# Altium footprint library standard.PcbLib: 330 footprints (part 14 of 21)
Each footprint in its own frame and in the unit in brackets; x right, y up, seen from the top. Pads: shape width x height; smd on the part's side, far side on the other; paste and mask are expansions set on the pad; w line width, h text height; cw(c..) or ccw(c..) is an arc to the next point about the centre after c.
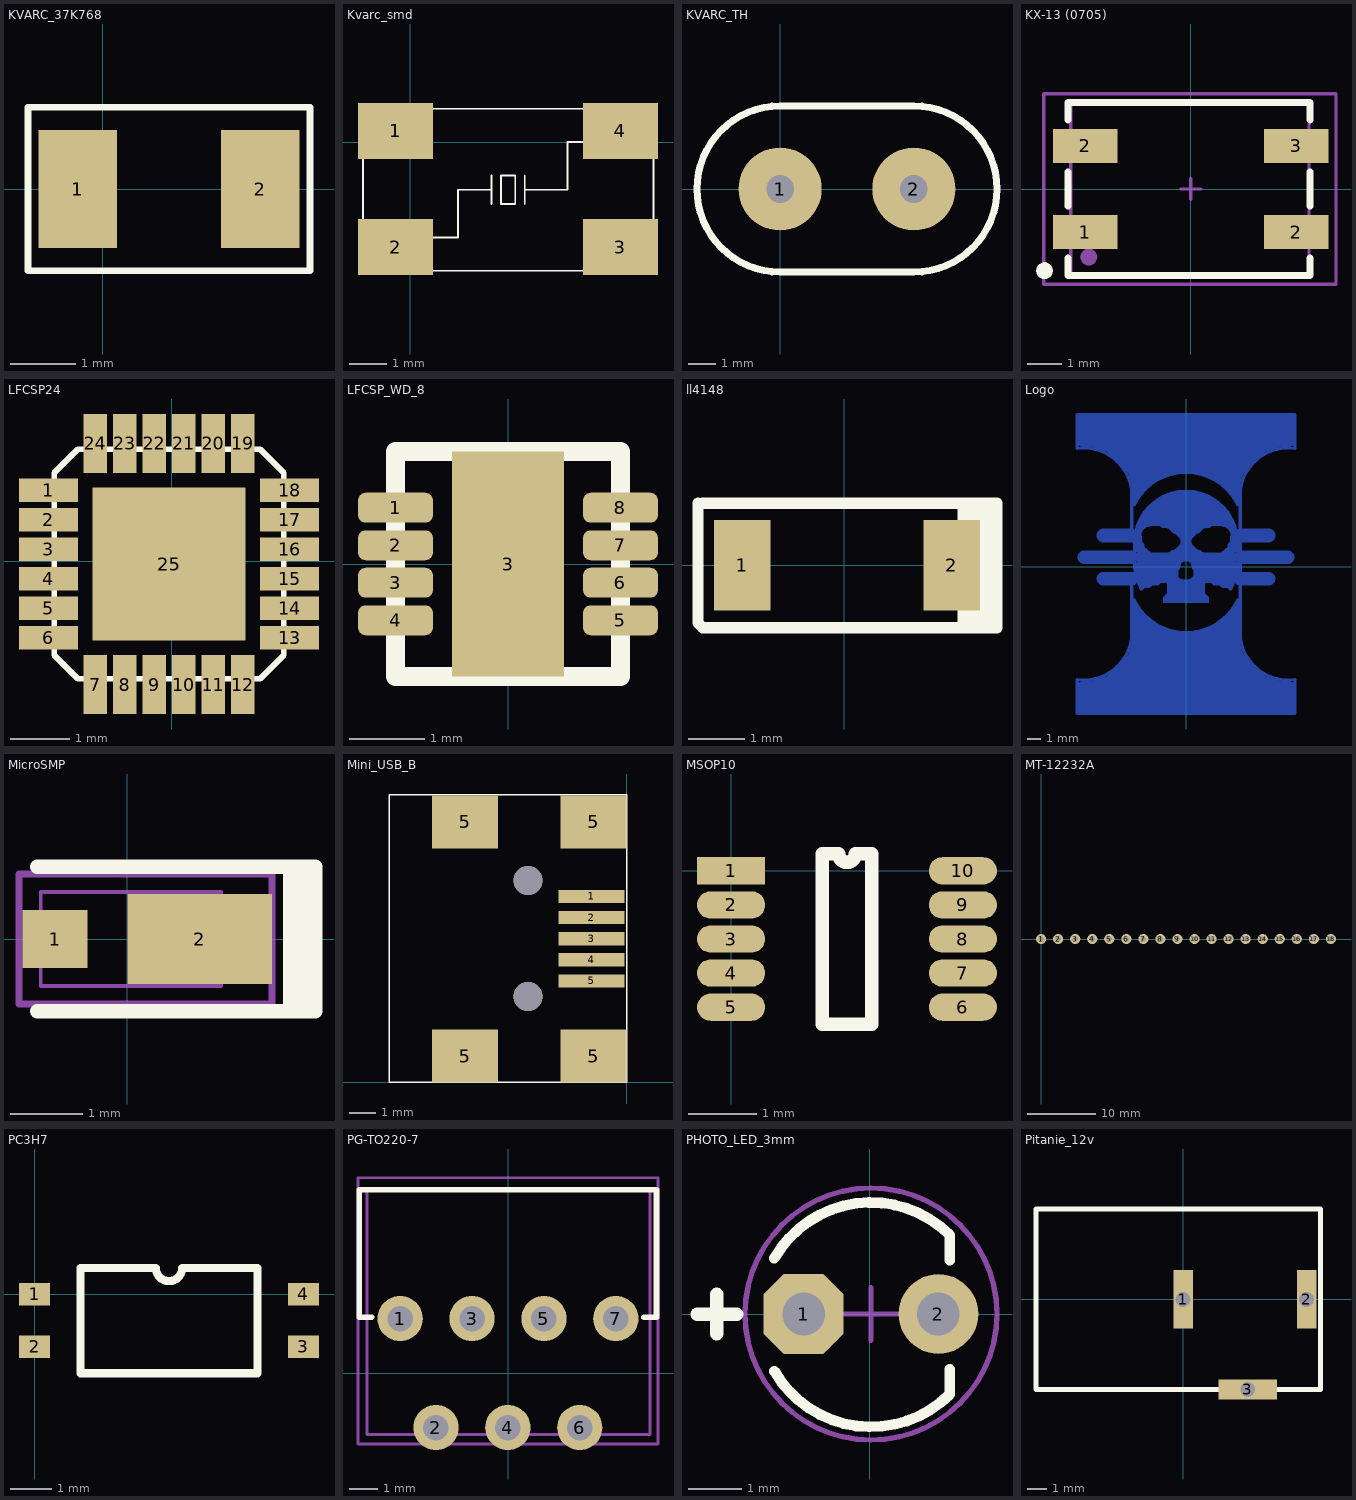
[diagram p13: the footprints below, top view; thin cyan lines are the x and y axes]

## KVARC_37K768 [mm]
pads (2):
  rect 1.2x1.8 smd: 1(-0.381,0) 2(2.413,0)
Top Overlay:
  lines w0.1: 0.375,1.25 1.235,1.25 3.175,1.25 3.175,-1.25 1.235,-1.25 -1.143,-1.25 -1.143,1.25 1.625,1.25

## Kvarc_smd [mm]
pads (4):
  rect 2x1.5 smd: 1(-0.4,0.3) 2(-0.4,-2.8) 3(5.6,-2.8) 4(5.6,0.3)
Top Overlay:
  lines w0.05: 0,-2.54 1.27,-2.54 1.27,-1.27 2.159,-1.27 ; 2.159,-1.651 2.159,-0.889 ; 3.048,-1.651 3.048,-0.889 ; 3.048,-1.27 4.191,-1.27 4.191,0 5.207,0 ; -1.27,-3.429 6.477,-3.429 6.477,0.889 -1.27,0.889 -1.27,-3.429 ; 2.413,-1.651 2.413,-0.889 2.794,-0.889 2.794,-1.651 2.413,-1.651

## KVARC_TH [mm]
pads (2):
  round 3 hole 1: 1(0,0) 2(4.826,0)
Top Overlay:
  lines w0.254: 0,-3 cw(c0,0) 0,3 4.826,3 cw(c4.826,0) 4.826,-3 0,-3
3D body "User Library-HC49S-1.STEP": height 3.6, standoff -3, extent -3.05,-2.245 7.93,2.246

## KX-13 (0705) [mm]
height 1.2
pads (6):
  rect 1.9x1 smd: 1(-3.1,-1.27) 2(-3.1,1.27) 2(3.1,-1.27) 3(3.1,1.27)
  round 0.5 on Top Overlay: ""(-4.3,-2.4)
  round 0.5 on Mech1: ""(-3,-2)
Top Overlay:
  lines w0.2: -3.608,-2.032 -3.608,-2.54 3.504,-2.54 3.504,-2.032 ; -3.608,-0.508 -3.608,0.508 ; -3.608,2.032 -3.608,2.54 3.504,2.54 3.504,2.032 ; 3.504,-0.508 3.504,0.508
Mechanical 1:
  lines w0.1: -3.526,-2.5 3.474,-2.5 3.474,2.5 -3.526,2.5 -3.526,-2.5
Mechanical 15:
  lines w0.1: -0.3,0 0.3,0 ; 0,-0.3 0,-0.2 0,0.3 ; -4.318,-2.794 -4.318,2.794 4.266,2.794 4.266,-2.794 -4.318,-2.794
3D body "KX-13 QSMD7.0x5.0x1.3.step": height 1.3, standoff 0, extent -3.526,-2.5 3.474,2.5

## LFCSP24 [mm]
pads (25):
  rect 1x0.4 smd: 1(-2.1,1.2) 2(-2.1,0.7) 3(-2.1,0.2) 4(-2.1,-0.3) 5(-2.1,-0.8) 6(-2.1,-1.3) 13(2,-1.3) 14(2,-0.8) 15(2,-0.3) 16(2,0.2) 17(2,0.7) 18(2,1.2)
  rect 0.4x1 smd: 7(-1.3,-2.1) 8(-0.8,-2.1) 9(-0.3,-2.1) 10(0.2,-2.1) 11(0.7,-2.1) 12(1.2,-2.1) 19(1.2,2) 20(0.7,2) 21(0.2,2) 22(-0.3,2) 23(-0.8,2) 24(-1.3,2)
  rect 2.6x2.6 smd: 25(-0.05,-0.05)
Top Overlay:
  lines w0.1: -2,-1.6 -1.6,-2 ; -2,-1.6 -2,1.5 ; -2,-1.6 -1.6,-2 ; -2,1.5 -1.6,1.9 ; -2,1.5 -1.6,1.9 ; -1.6,-2 1.5,-2 ; -1.6,1.9 1.5,1.9 1.9,1.5 1.9,-1.6 ; 1.5,-2 1.9,-1.6 ; 1.5,-2 1.9,-1.6

## LFCSP_WD_8 [mm] "8-Lead Lead Frame Chip Scale Package [LFCSP_WD]"
height 0.8
pads (9):
  rrect50% 1x0.4 smd paste+0 mask+0.102: 1(-1.5,0.75) 2(-1.5,0.25) 3(-1.5,-0.25) 4(-1.5,-0.75) 5(1.5,-0.75) 6(1.5,-0.25) 7(1.5,0.25) 8(1.5,0.75)
  rect 1.5x3 smd: 3(0,0)
Top Overlay:
  lines w0.254: -1.5,-1.5 1.5,-1.5 1.5,1.5 -1.5,1.5 -1.5,-1.5

## ll4148 [mm]
pads (2):
  rect 1x1.6 smd: 1(-1.8,0) 2(1.9,0)
Top Overlay:
  rectangle: 2,-1.1 2.7,1.148
  lines w0.2: -2.582,1.1 -2.582,0.932 -2.582,-1.018 -2.5,-1.1 2.7,-1.1 2.7,1.1 -2.5,1.1

## Logo [mm]
Bottom Layer:
  region: 108 vertices and 3 holes, not listed, extent -3.865,-2.665 3.865,5.674
  region: -3.58,-2.667 -3.28,-3.117 -2.923,-3.523 -2.517,-3.88 -2.067,-4.18 -1.582,-4.419 -1.07,-4.593 -0.54,-4.698 0,-4.734 0.54,-4.698 1.07,-4.593 1.582,-4.419 2.067,-4.18 2.517,-3.88 2.923,-3.523 3.28,-3.117 3.58,-2.667 3.741,-2.34 3.865,-2.369 3.865,-5.3 3.871,-5.315 3.869,-5.319 3.873,-5.374 4.008,-5.935 4.228,-6.467 4.529,-6.958 4.904,-7.396 5.342,-7.771 5.833,-8.072 6.365,-8.292 6.926,-8.427 7.5,-8.472 7.771,-8.45 7.865,-8.537 7.865,-10.665 -7.865,-10.665 -7.865,-8.537 -7.771,-8.45 -7.5,-8.472 -6.926,-8.427 -6.365,-8.292 -5.833,-8.072 -5.342,-7.771 -4.904,-7.396 -4.529,-6.958 -4.228,-6.467 -4.008,-5.935 -3.873,-5.374 -3.869,-5.319 -3.871,-5.315 -3.865,-5.3 -3.865,-2.369 -3.741,-2.34
  region: 7.865,8.937 7.771,8.85 7.5,8.872 6.926,8.827 6.365,8.692 5.833,8.472 5.342,8.171 4.904,7.796 4.529,7.358 4.228,6.867 4.008,6.335 3.873,5.774 3.869,5.719 3.871,5.715 3.865,5.7 3.865,4.469 3.741,4.44 3.58,4.767 3.28,5.217 2.923,5.623 2.517,5.98 2.067,6.28 1.582,6.519 1.07,6.693 0.54,6.798 0,6.834 -0.54,6.798 -1.07,6.693 -1.582,6.519 -2.067,6.28 -2.517,5.98 -2.923,5.623 -3.28,5.217 -3.58,4.767 -3.741,4.44 -3.865,4.469 -3.865,5.7 -3.871,5.715 -3.869,5.719 -3.873,5.774 -4.008,6.335 -4.228,6.867 -4.529,7.358 -4.904,7.796 -5.342,8.171 -5.833,8.472 -6.365,8.692 -6.926,8.827 -7.5,8.872 -7.771,8.85 -7.865,8.937 -7.865,11.065 7.865,11.065
  lines w0.25: -4,-0.9 -4,-5.3 cw(c-7.5,-4.8) -8,-8.3 -8,-10.8 0,-10.8 8,-10.8 8,-8.3 cw(c7.5,-4.8) 4,-5.3 4,5.7 cw(c7.5,5.2) 8,8.7 8,11.2 0,11.2 -8,11.2 -8,8.7 cw(c-7.5,5.2) -4,5.7 -4,2.3
  lines w1: -7.5,0.7 -4,0.7 ; -6.1,-0.9 -4,-0.9 ; -6.1,2.3 -4,2.3 ; 4,-0.9 6.1,-0.9 ; 4,0.7 7.5,0.7 ; 4,2.3 6.1,2.3

## MicroSMP [mm] "Schottky Diode, 2-Leads, Body 2,2x1,3mm, 0.4W"
height 0.7
pads (3):
  rect 0.9x0.8 smd: 1(-1,0)
  rect 2x1.25 smd: 2(1,0)
  round 0.5 on Mech1: ""(0.9,0.3)
Top Overlay:
  rectangle: 2.15,-1 2.65,0.9
  lines w0.2: -1.25,-1 2.6,-1 2.6,1 -1.25,1
Mechanical 1:
  lines w0.05: -1.2,-0.65 1.3,-0.65 1.3,0.65 -1.2,0.65 -1.2,-0.65
Mechanical 15:
  lines w0.1: 0.85,0 1.85,0 ; 1.35,-0.5 1.35,0.5 ; -1.5,-0.9 2,-0.9 2,0.9 -1.5,0.9 -1.5,-0.9
3D body "MicroSMP-1.STEP": height 0.71, standoff 0.03, extent -1.21,-0.65 1.29,0.65

## Mini_USB_B [mm]
pads (9):
  rect 2.5x0.5 smd: 1(-1.327,7.05) 2(-1.327,6.25) 3(-1.327,5.45) 4(-1.327,4.65) 5(-1.327,3.85)
  rect 2.5x2 smd: 5(-6.125,1) 5(-6.125,9.875) 5(-1.25,1) 5(-1.25,9.875)
via -3.75,7.65 diameter 1.1 hole 1.1
via -3.75,3.25 diameter 1.1 hole 1.1
Top Overlay:
  lines w0.05: -9,0 -9,10.9 0,10.9 0,0 -9,0

## MSOP10 [mm]
pads (10):
  rect 1x0.4 smd: 1(0,0)
  oval 1x0.4 smd: 2(0,-0.5) 3(0,-1) 4(0,-1.5) 5(0,-2) 6(3.4,-2) 7(3.4,-1.5) 8(3.4,-1) 9(3.4,-0.5) 10(3.4,0)
Top Overlay:
  lines w0.2: 1.335,-2.25 2.065,-2.25 2.065,0.25 1.825,0.25 cw(c1.7,0.25) 1.575,0.25 1.335,0.25 1.335,-2.25

## MT-12232A [mm]
pads (18):
  round 1.5 hole 0.8: 1(0,0) 2(2.5,0) 3(5,0) 4(7.5,0) 5(10,0) 6(12.5,0) 7(15,0) 8(17.5,0) 9(20,0) 10(22.5,0) 11(25,0) 12(27.5,0) 13(30,0) 14(32.5,0) 15(35,0) 16(37.5,0) 17(40,0) 18(42.5,0)

## PC3H7 [mm]
pads (4):
  rect 0.75x0.55 smd: 1(0,0) 2(0,-1.27) 3(6.5,-1.27) 4(6.5,0)
Top Overlay:
  lines w0.2: 1.11,-1.905 5.39,-1.905 5.39,0.635 3.567,0.635 cw(c3.25,0.635) 2.932,0.635 1.11,0.635 1.11,-1.905

## PG-TO220-7 [mm] "5-Lead Plastic TO-220"
height 20
pads (7):
  round 1.6 hole 0.9: 1(-3.81,1.925) 2(-2.545,-1.925) 3(-1.27,1.925) 4(-0.005,-1.925) 5(1.27,1.925) 6(2.535,-1.925) 7(3.81,1.925)
Top Overlay:
  lines w0.2: -4.818,1.975 -5.255,1.975 -5.255,6.475 5.245,6.475 5.245,1.975 4.807,1.975
Mechanical 1:
  lines w0.1: -4.98,-2.175 5.02,-2.175 5.02,6.475 -4.98,6.475 -4.98,-2.175
Mechanical 15:
  lines w0.1: -5.3,-2.5 5.3,-2.5 5.3,6.9 -5.3,6.9 -5.3,-2.5
3D body "PG-TO220-7-1.STEP": height 19.95, standoff -1.3, extent -4.98,-2.175 5.02,6.475

## PHOTO_LED_3mm [mm]
pads (2):
  oct 1.5x1.5 hole 0.8: 1(-1.245,0)
  round 1.5 hole 0.8: 2(1.295,0)
Top Overlay:
  lines w0.2: 1.51,-1.51 cw(c0.025,-0.025) -1.794,-1.075 ccw(c0.025,-0.025) 1.51,-1.51 ; 1.51,-1.51 1.51,-1.04 1.51,-1.51 ; 1.51,1.485 ccw(c0.025,0) -1.794,1.05 cw(c0.025,0) 1.51,1.485 ; 1.51,1.485 1.51,1.015 1.51,1.485
  lines w0.254: -3.25,0 -2.5,0 ; -2.875,-0.375 -2.875,0.375
Mechanical 1:
  circle w0.1: c0.025,0 r2.372
Mechanical 15:
  circle w0.1: c0.025,0 r2.372
  lines w0.1: -0.475,0 0.525,0 ; 0.025,-0.5 0.025,0.5
3D body "Photodiode 3мм.x_t": height 6.4, standoff -4.9, extent -1.925,-1.947 1.645,1.947

## Pitanie_12v [mm]
pads (3):
  rect 1x3 hole 0.762: 1(0,0) 2(6.3,0)
  rect 3x1 hole 0.762: 3(3.3,-4.6)
Top Overlay:
  lines w0.254: -7.5,-4.6 7,-4.6 7,4.6 -7.5,4.6 -7.5,0 -7.5,-4.6